# Altium footprint library VC_PCBLib.PcbLib: 63 footprints (part 3 of 4)
Each footprint in its own frame and in the unit in brackets; x right, y up, seen from the top. Pads: shape width x height; smd on the part's side, far side on the other; paste and mask are expansions set on the pad; w line width, h text height; cw(c..) or ccw(c..) is an arc to the next point about the centre after c.
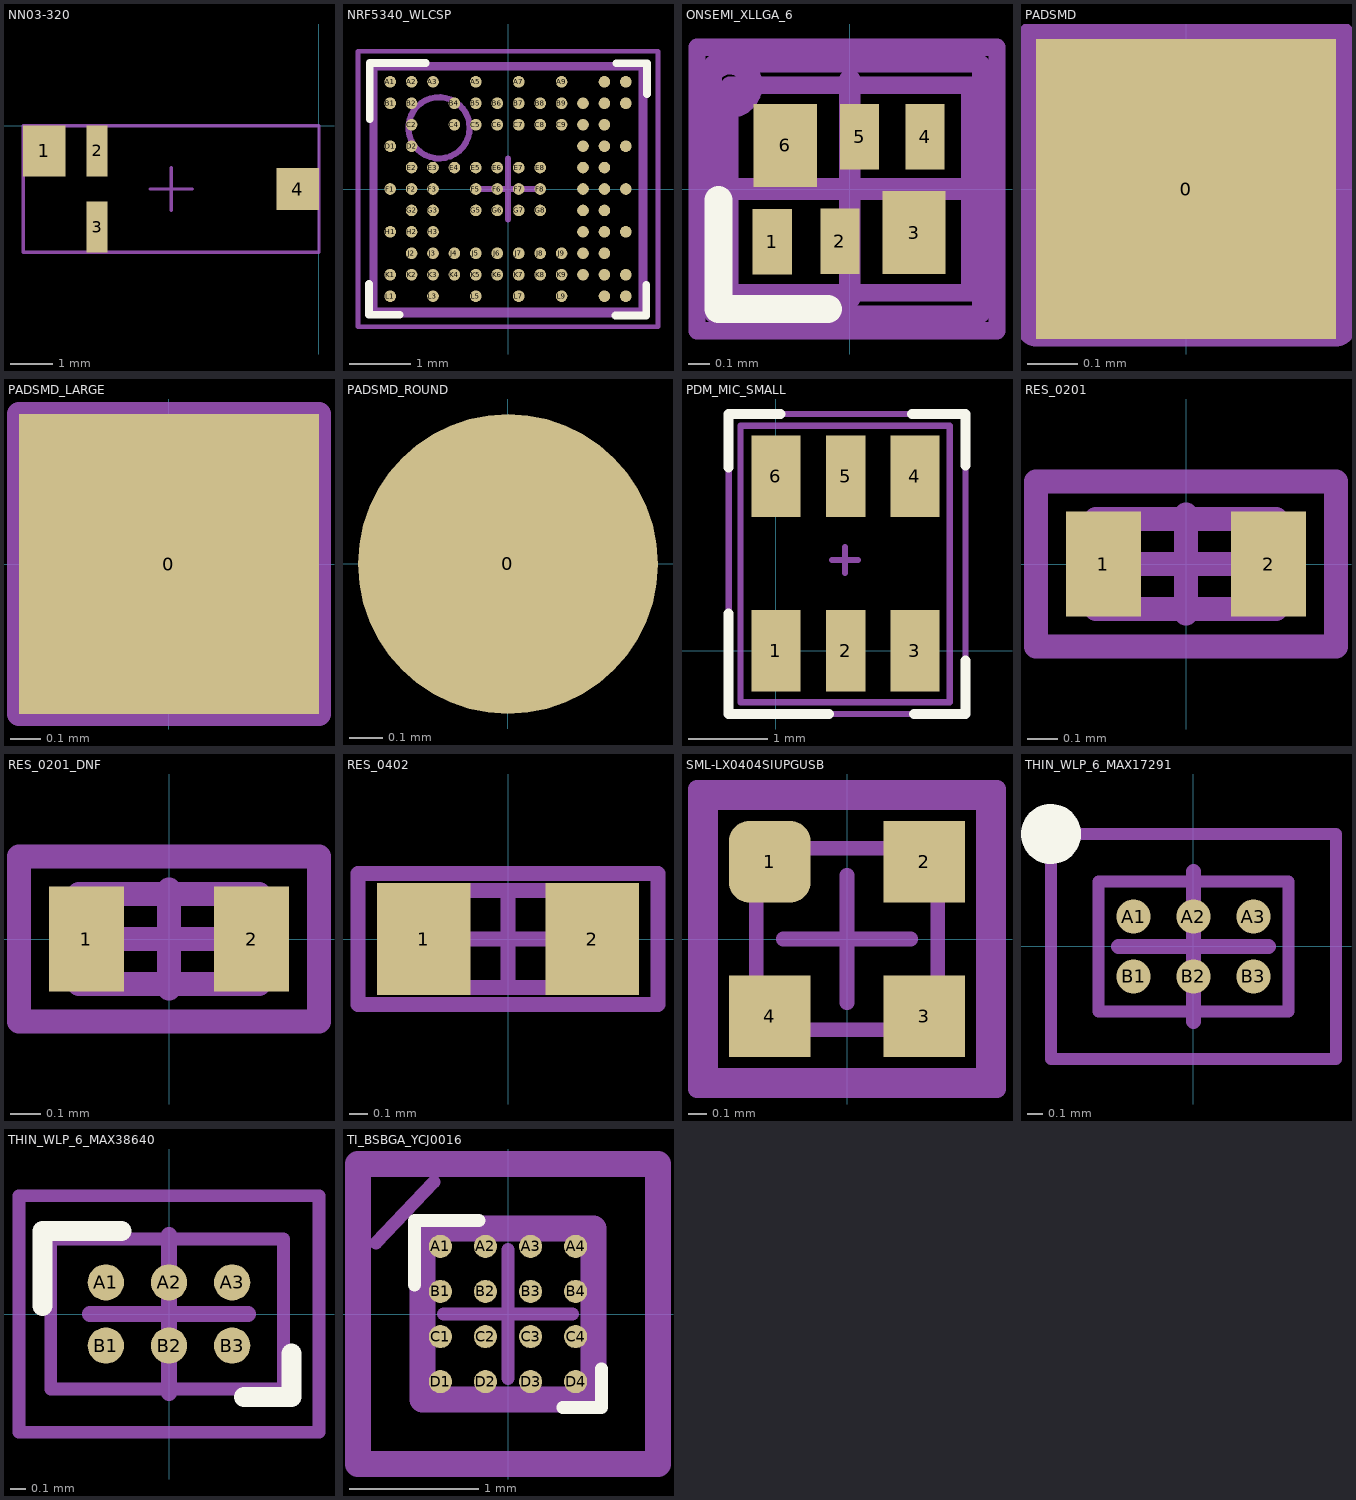
[diagram p2: the footprints below, top view; thin cyan lines are the x and y axes]

## MOLEX_5050664822 [mm]

## NN03-320 [mm]
pads (4):
  rect 1x1.2 smd: 1(-6.5,-0.6)
  rect 0.5x1.2 smd: 2(-5.25,-0.6) 3(-5.25,-2.4)
  rect 1x1 smd: 4(-0.5,-1.5)
Top Assembly:
  lines w0.08: -7,-3 0,-3 0,0 -7,0 -7,-3
Top Component Outline:
  lines w0.08: -7,-3 0,-3 0,0 -7,0 -7,-3
Top Courtyard:
  lines w0.08: -7,-3 0,-3 0,0 -7,0 -7,-3
Top Component Center:
  lines w0.08: -4,-1.5 -3,-1.5 ; -3.5,-2 -3.5,-1
3D body "NN03-320_alligned.STEP": height 2.01, standoff -0.01, extent -7,-3 0,0

## NRF5340_WLCSP [mm]
pads (95):
  round 0.19 smd paste+0 mask+0: A1(-1.925,1.75) A2(-1.575,1.75) A3(-1.225,1.75) A5(-0.525,1.75) A7(0.175,1.75) A9(0.875,1.75) A11(1.575,1.75) A12(1.925,1.75) B1(-1.925,1.4) B2(-1.575,1.4) B4(-0.875,1.4) B5(-0.525,1.4) B6(-0.175,1.4) B7(0.175,1.4) B8(0.525,1.4) B9(0.875,1.4) B10(1.225,1.4) B11(1.575,1.4) B12(1.925,1.4) C2(-1.575,1.05) C4(-0.875,1.05) C5(-0.525,1.05) C6(-0.175,1.05) C7(0.175,1.05) C8(0.525,1.05) C9(0.875,1.05) C10(1.225,1.05) C11(1.575,1.05) D1(-1.925,0.7) D2(-1.575,0.7) D10(1.225,0.7) D11(1.575,0.7) D12(1.925,0.7) E2(-1.575,0.35) E3(-1.225,0.35) E4(-0.875,0.35) E5(-0.525,0.35) E6(-0.175,0.35) E7(0.175,0.35) E8(0.525,0.35) E10(1.225,0.35) E11(1.575,0.35) F1(-1.925,0) F2(-1.575,0) F3(-1.225,0) F5(-0.525,0) F6(-0.175,0) F7(0.175,0) F8(0.525,0) F10(1.225,0) F11(1.575,0) F12(1.925,0) G2(-1.575,-0.35) G3(-1.225,-0.35) G5(-0.525,-0.35) G6(-0.175,-0.35) G7(0.175,-0.35) G8(0.525,-0.35) G10(1.225,-0.35) G11(1.575,-0.35) H1(-1.925,-0.7) H2(-1.575,-0.7) H3(-1.225,-0.7) H10(1.225,-0.7) H11(1.575,-0.7) H12(1.925,-0.7) J2(-1.575,-1.05) J3(-1.225,-1.05) J4(-0.875,-1.05) J5(-0.525,-1.05) J6(-0.175,-1.05) J7(0.175,-1.05) J8(0.525,-1.05) J9(0.875,-1.05) J10(1.225,-1.05) J11(1.575,-1.05) K1(-1.925,-1.4) K2(-1.575,-1.4) K3(-1.225,-1.4) K4(-0.875,-1.4) K5(-0.525,-1.4) K6(-0.175,-1.4) K7(0.175,-1.4) K8(0.525,-1.4) K9(0.875,-1.4) K10(1.225,-1.4) K11(1.575,-1.4) K12(1.925,-1.4) L1(-1.925,-1.75) L3(-1.225,-1.75) L5(-0.525,-1.75) L7(0.175,-1.75) L9(0.875,-1.75) L11(1.575,-1.75) L12(1.925,-1.75)
Top Overlay:
  lines w0.125: -2.261,1.143 -2.261,2.057 -1.346,2.057
  lines w0.127: -2.269,-1.554 -2.269,-2.054 -1.769,-2.054 ; 1.757,-2.066 2.257,-2.066 2.257,-1.566 ; 1.769,2.054 2.269,2.054 2.269,1.554
Top Assembly:
  circle w0.1: c-1.126,0.999 r0.5
  lines w0.08: -2.226,-2.057 -2.226,2.032 2.235,2.032 2.235,-2.057 -2.226,-2.057
Top Component Outline:
  lines w0.1: -2.185,-1.985 -2.185,1.985 2.185,1.985 2.185,-1.985 -2.185,-1.985
Top Courtyard:
  lines w0.08: -2.45,-2.25 2.45,-2.25 2.45,2.25 -2.45,2.25 -2.45,-2.25
Top Component Center:
  lines w0.1: -0.5,0 0.5,0 ; 0,-0.5 0,0.5
3D body "BGA132C35P12X11_437X397X50.step": height 0.5, standoff 0, extent -2.185,-1.985 2.185,1.985

## ONSEMI_XLLGA_6 [mm]
pads (6):
  rect 0.18x0.3 smd: 1(-0.356,-0.242) 2(-0.045,-0.24) 4(0.345,0.24) 5(0.045,0.24)
  rect 0.29x0.38 smd: 3(0.295,-0.2) 6(-0.295,0.2)
Top Overlay:
  lines w0.127: -0.601,-0.05 -0.601,-0.55 -0.1,-0.55
Top Assembly:
  circle w0.1: c-0.55,0.475 r0.1
  lines w0.08: -0.7,-0.65 -0.7,0.65 0.675,0.65 0.675,-0.65 -0.7,-0.65
Top Component Outline:
  lines w0.08: -0.55,-0.475 0.55,-0.475 0.55,0.475 -0.55,0.475 -0.55,-0.475
Top Courtyard:
  lines w0.08: -0.625,-0.575 -0.625,0.575 0.6,0.575 0.6,-0.575 -0.625,-0.575
Top Component Center:
  lines w0.1: -0.5,0 0.5,0 ; 0,-0.5 0,0.5
3D body: height 0.54, standoff 0.1, extent -0.45,-0.325 0.45,0.325

## PADSMD [mm] "Small SMD Pad"
height 0.52
pads (1):
  rect 0.6x0.6 smd: 0(0,0)
Top Assembly:
  lines w0.08: -0.3,-0.275 0.3,-0.275 ; -0.3,-0.275 -0.3,0.3 ; -0.3,-0.275 0.3,-0.275 ; -0.3,-0.275 -0.3,0.3 ; -0.3,0.3 0.3,0.3 ; -0.3,0.3 0.3,0.3 ; 0.3,-0.275 0.3,0.3 ; 0.3,-0.275 0.3,0.3
Top Courtyard:
  lines w0.08: -0.3,-0.275 -0.3,0.3 0.3,0.3 0.3,-0.275 -0.3,-0.275
Top Component Center:
  lines w0.08: -0.26,0 0.26,0 ; 0,-0.26 0,0.26

## PADSMD_LARGE [mm] "Large SMD Pad."
height 0.89
pads (1):
  rect 1x1 smd: 0(0,0)
Top Assembly:
  lines w0.08: -0.5,-0.5 -0.5,0.5 0.5,0.5 0.5,-0.5 -0.5,-0.5
Top Courtyard:
  lines w0.08: -0.5,-0.5 -0.5,0.5 0.5,0.5 0.5,-0.5 -0.5,-0.5
Top Component Center:
  lines w0.08: -0.475,0 0.475,0 ; 0,-0.475 0,0.475

## PADSMD_ROUND [mm] "Small SMD Pad"
height 0.52
pads (1):
  round 0.9 smd: 0(0,0)

## PDM_MIC_SMALL [mm]
pads (6):
  rect 0.62x1.03 smd: 1(0,0) 3(1.76,0) 4(1.76,2.21) 6(0,2.21)
  rect 0.5x1.03 smd: 2(0.881,0) 5(0.881,2.21)
Top Overlay:
  lines w0.127: -0.601,-0.8 0.669,-0.8 ; -0.6,2.322 -0.6,3 0.054,3 ; -0.6,-0.8 -0.6,0.47 ; 1.722,3 2.4,3 2.4,2.346 ; 1.746,-0.8 2.4,-0.8 2.4,-0.122
Top Assembly:
  lines w0.08: -0.6,-0.8 2.4,-0.8 2.4,3 -0.6,3 -0.6,-0.8
Top Component Outline:
  lines w0.08: -0.45,-0.65 2.2,-0.65 2.2,2.85 -0.45,2.85 -0.45,-0.65
Top Courtyard:
  lines w0.08: -0.6,-0.8 2.4,-0.8 2.4,3 -0.6,3 -0.6,-0.8
Top Component Center:
  lines w0.08: 0.71,1.15 1.04,1.15 ; 0.875,0.985 0.875,1.315
3D body "ICS-41351 3D POD v1.2.step": height 0.98, standoff 0, extent -0.45,-0.65 2.2,2.85

## RES_0201 [mm] "Chip Resistor, 2-Leads, Body 0.60x0.30mm, IPC Medium Density"
height 0.26
pads (2):
  rect 0.25x0.35 smd: 1(-0.275,0) 2(0.275,0)
Top Assembly:
  lines w0.08: -0.5,-0.275 -0.5,0.275 0.5,0.275 0.5,-0.275 -0.5,-0.275
Top Component Outline:
  lines w0.08: -0.3,-0.15 -0.3,0.15 0.3,0.15 0.3,-0.15 -0.3,-0.15
Top Courtyard:
  lines w0.08: -0.5,-0.275 0.5,-0.275 0.5,0.275 -0.5,0.275 -0.5,-0.275
Top Component Center:
  lines w0.08: -0.165,0 0.165,0 ; -0.05,0 0.05,0 ; 0,-0.165 0,0.165 ; 0,-0.05 0,0.05
3D body "R_0201_0603Metric.step": height 0.22, standoff -0.01, extent -0.3,-0.15 0.3,0.15

## RES_0201_DNF [mm] "Chip Resistor, 2-Leads, Body 0.60x0.30mm, IPC Medium Density"
height 0.26
pads (2):
  rect 0.25x0.35 smd: 1(-0.275,0) 2(0.275,0)
Top Assembly:
  lines w0.08: -0.5,-0.275 0.5,-0.275 0.5,0.275 -0.5,0.275 -0.5,-0.275
Top Component Outline:
  lines w0.08: -0.3,-0.15 0.3,-0.15 0.3,0.15 -0.3,0.15 -0.3,-0.15
Top Courtyard:
  lines w0.08: -0.5,-0.275 -0.5,0.275 0.5,0.275 0.5,-0.275 -0.5,-0.275
Top Component Center:
  lines w0.08: -0.165,0 0.165,0 ; -0.05,0 0.05,0 ; 0,-0.165 0,0.165 ; 0,-0.05 0,0.05
3D body "R_0201_0603Metric.step": height 0.22, standoff -0.01, extent -0.3,-0.15 0.3,0.15

## RES_0402 [mm]
height 0.52
pads (2):
  rect 0.5x0.6 smd: 1(-0.45,0) 2(0.45,0)
Top Assembly:
  lines w0.08: -0.8,-0.35 -0.8,0.35 0.8,0.35 0.8,-0.35 -0.8,-0.35
Top Component Outline:
  lines w0.08: -0.5,-0.26 0.5,-0.26 0.5,0.26 -0.5,0.26 -0.5,-0.26
Top Courtyard:
  lines w0.08: -0.8,-0.35 0.8,-0.35 0.8,0.35 -0.8,0.35 -0.8,-0.35
Top Component Center:
  lines w0.08: -0.26,0 0.26,0 ; 0,-0.26 0,0.26
3D body "NTC 0402.STEP": height 0.56, standoff 0.04, extent -0.5,-0.26 0.5,0.264

## SML-LX0404SIUPGUSB [mm]
pads (4):
  rrect50% 0.45x0.45 smd: 1(-0.425,0.425)
  rect 0.45x0.45 smd: 2(0.425,0.425) 3(0.425,-0.425) 4(-0.425,-0.425)
Top Assembly:
  lines w0.1: -0.825,-0.825 0.825,-0.825 0.825,0.825 -0.825,0.825 -0.825,-0.825
Top Component Outline:
  lines w0.08: -0.5,-0.5 -0.5,0.5 0.5,0.5 0.5,-0.5 -0.5,-0.5
Top Courtyard:
  lines w0.08: -0.75,-0.75 0.75,-0.75 0.75,0.75 -0.75,0.75 -0.75,-0.75
Top Component Center:
  lines w0.08: -0.35,0 0.35,0 ; 0,-0.35 0,0.35
3D body "Diode_Lumex_SML-LX0404SIUPGUSB_eec.STEP": height 0.25, standoff 0, extent -0.5,-0.5 0.5,0.5

## SOP50 [mm]

## THIN_WLP_6_MAX17291 [mm]
pads (6):
  round 0.229 smd paste+0 mask+0: A1(-0.4,0.2) A2(0,0.2) A3(0.4,0.2) B1(-0.4,-0.2) B2(0,-0.2) B3(0.4,-0.2)
Top Overlay:
  circle w0.2: c-0.95,0.75 r0.1
Top Assembly:
  lines w0.08: -0.95,-0.75 0.95,-0.75 0.95,0.75 -0.95,0.75 -0.95,-0.75
Top Component Outline:
  lines w0.08: -0.634,-0.434 -0.634,0.434 0.634,0.434 0.634,-0.434 -0.634,-0.434
Top Courtyard:
  lines w0.08: -0.95,-0.75 0.95,-0.75 0.95,0.75 -0.95,0.75 -0.95,-0.75
Top Component Center:
  lines w0.1: -0.5,0 0.5,0 ; 0,-0.5 0,0.5
3D body "IC_Maxim_MAX17291ANT+_eec.STEP": height 0.25, standoff 0, extent -1.143,-0.934 1.125,0.934

## THIN_WLP_6_MAX38640 [mm]
pads (6):
  round 0.229 smd paste+0 mask+0: A1(-0.4,0.2) A2(0,0.2) A3(0.4,0.2) B1(-0.4,-0.2) B2(0,-0.2) B3(0.4,-0.2)
Top Overlay:
  lines w0.127: -0.801,0.05 -0.801,0.525 -0.3,0.525 ; 0.475,-0.525 0.776,-0.525 0.776,-0.25
Top Assembly:
  lines w0.08: -0.95,-0.75 0.95,-0.75 0.95,0.75 -0.95,0.75 -0.95,-0.75
Top Component Outline:
  lines w0.08: -0.75,-0.475 -0.75,0.475 0.725,0.475 0.725,-0.475 -0.75,-0.475
Top Courtyard:
  lines w0.08: -0.95,-0.75 0.95,-0.75 0.95,0.75 -0.95,0.75 -0.95,-0.75
Top Component Center:
  lines w0.1: -0.5,0 0.5,0 ; 0,-0.5 0,0.5
3D body "21-100128A_N60E12_MXM.step": height 0.5, standoff 0, extent -0.733,-0.457 0.715,0.457

## TI_BSBGA_YCJ0016 [mm]
pads (16):
  round 0.18 smd paste+0 mask+0: A1(-0.525,0.525) A2(-0.175,0.525) A3(0.175,0.525) A4(0.525,0.525) B1(-0.525,0.175) B2(-0.175,0.175) B3(0.175,0.175) B4(0.525,0.175) C1(-0.525,-0.175) C2(-0.175,-0.175) C3(0.175,-0.175) C4(0.525,-0.175) D1(-0.525,-0.525) D2(-0.175,-0.525) D3(0.175,-0.525) D4(0.525,-0.525)
Top Overlay:
  lines w0.1: -0.725,0.225 -0.725,0.725 -0.225,0.725 ; 0.425,-0.725 0.725,-0.725 0.725,-0.425
Top Assembly:
  lines w0.1: -1.025,0.55 -0.575,1.025
  lines w0.2: -1.165,-1.165 1.165,-1.165 1.165,1.165 -1.165,1.165 -1.165,-1.165
Top Component Outline:
  lines w0.2: -0.664,-0.664 -0.664,0.664 0.664,0.664 0.664,-0.664 -0.664,-0.664
Top Component Center:
  lines w0.1: -0.5,0 0.5,0 ; 0,-0.5 0,0.5
3D body "IC_Texas_Instruments_TMUX1575YCJR_eec.STEP": height 0.25, standoff 0, extent -1.165,-1.165 1.165,1.165